# Altium footprint library Connector_PinHeader_2.00mm.PcbLib: 278 footprints (part 3 of 18)
Each footprint in its own frame and in the unit in brackets; x right, y up, seen from the top. Pads: shape width x height; smd on the part's side, far side on the other; paste and mask are expansions set on the pad; w line width, h text height; cw(c..) or ccw(c..) is an arc to the next point about the centre after c.
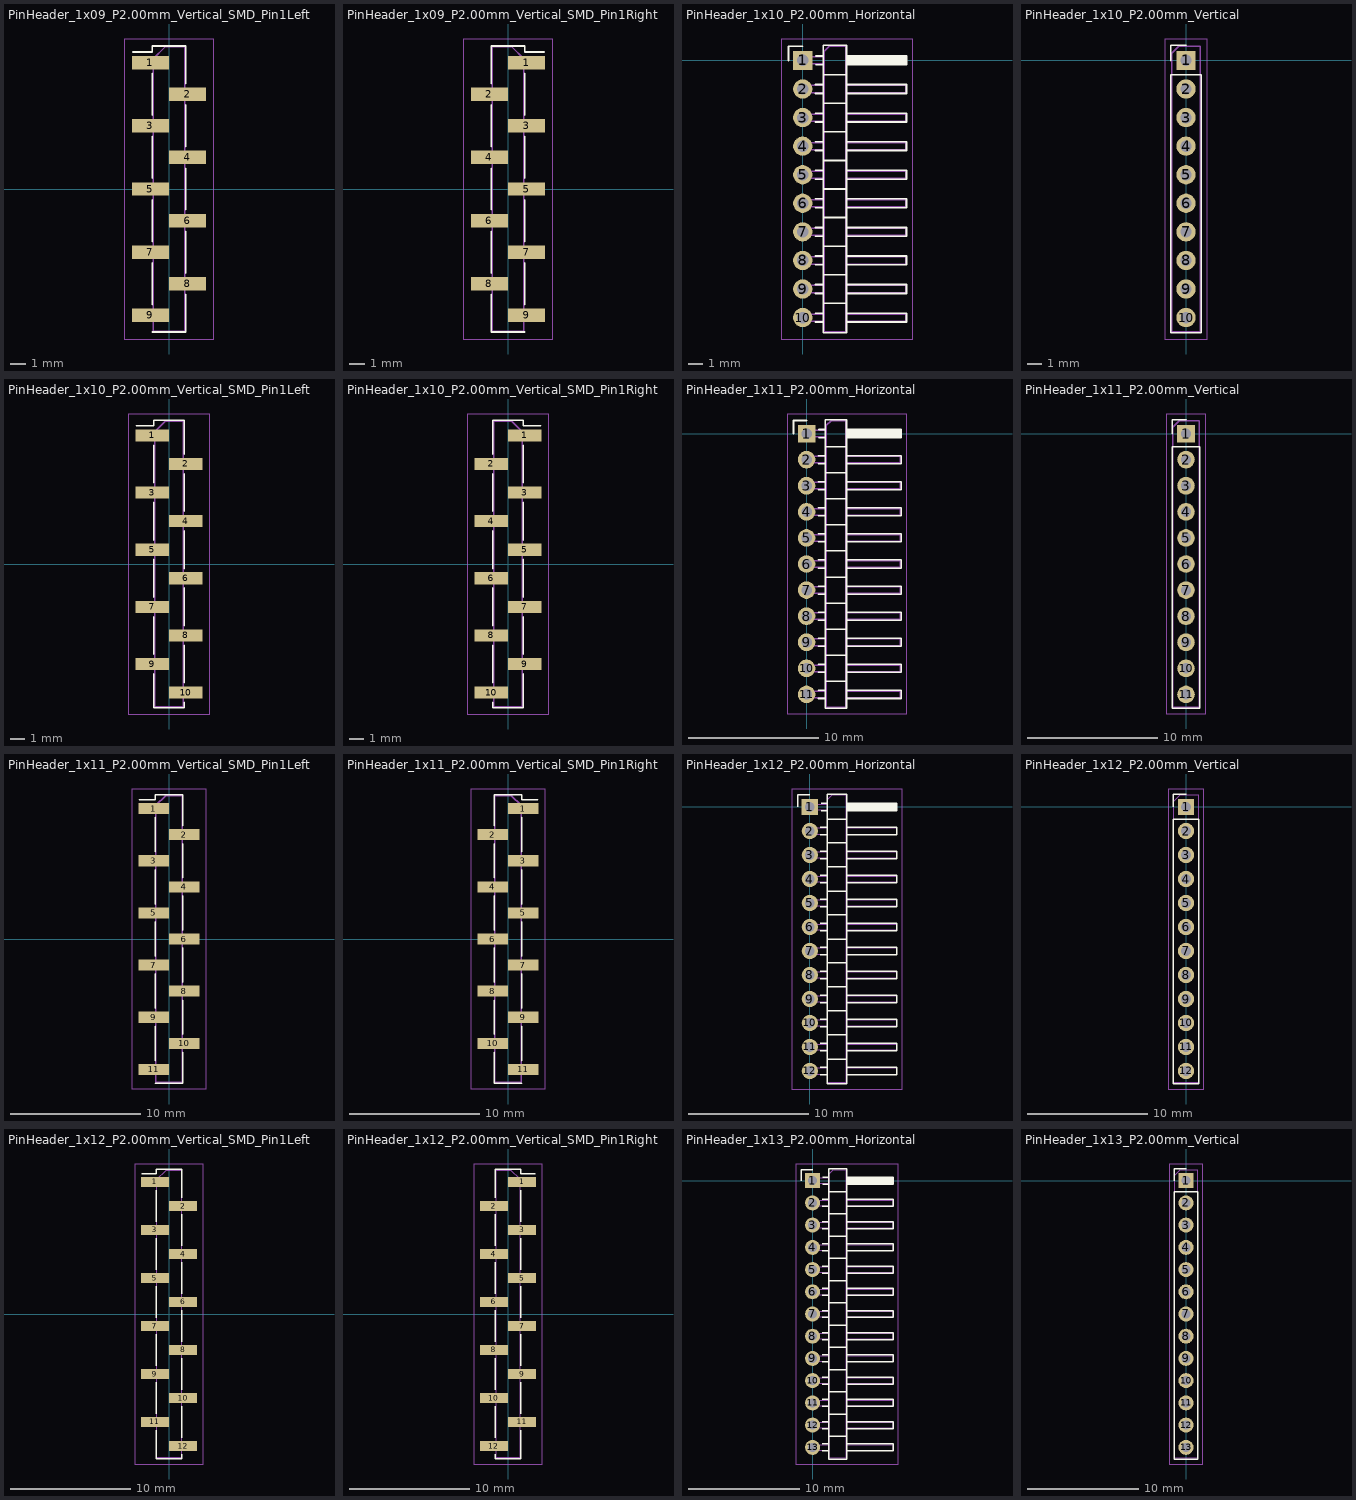
[diagram p2: the footprints below, top view; thin cyan lines are the x and y axes]

## PinHeader_1x09_P2.00mm_Vertical_SMD_Pin1Left [mm]
pads (9):
  rect 2.35x0.85 smd: 1(-1.175,8) 2(1.175,6) 3(-1.175,4) 4(1.175,2) 5(-1.175,0) 6(1.175,-2) 7(-1.175,-4) 8(1.175,-6) 9(-1.175,-8)
F.SilkS:
  lines w0.12: -2.29,8.685 -1.06,8.685 -1.06,9.06 1.06,9.06 1.06,6.685 ; -1.06,-9.06 1.06,-9.06 ; -1.06,-7.315 -1.06,-4.685 ; -1.06,-3.315 -1.06,-0.685 ; -1.06,0.685 -1.06,3.315 ; -1.06,4.685 -1.06,7.315 ; 1.06,-8.685 1.06,-9.06 ; 1.06,-6.685 1.06,-9.06 ; 1.06,-5.315 1.06,-2.685 ; 1.06,-1.315 1.06,1.315 ; 1.06,2.685 1.06,5.315
F.CrtYd:
  lines w0.05: -2.85,-9.5 2.85,-9.5 2.85,9.5 -2.85,9.5 -2.85,-9.5
F.Fab:
  lines w0.1: -1,-8.25 -2.1,-8.25 -2.1,-7.75 -1,-7.75 ; -1,-4.25 -2.1,-4.25 -2.1,-3.75 -1,-3.75 ; -1,-0.25 -2.1,-0.25 -2.1,0.25 -1,0.25 ; -1,3.75 -2.1,3.75 -2.1,4.25 -1,4.25 ; -1,7.75 -2.1,7.75 -2.1,8.25 -1,8.25 ; 1,-6.25 2.1,-6.25 2.1,-5.75 1,-5.75 ; 1,-2.25 2.1,-2.25 2.1,-1.75 1,-1.75 ; 1,1.75 2.1,1.75 2.1,2.25 1,2.25 ; 1,5.75 2.1,5.75 2.1,6.25 1,6.25 ; -1,8.25 -0.25,9 1,9 1,-9 -1,-9 -1,8.25
  text "'.Designator'" at 0.84,-4.047 h1

## PinHeader_1x09_P2.00mm_Vertical_SMD_Pin1Right [mm]
pads (9):
  rect 2.35x0.85 smd: 1(1.175,8) 2(-1.175,6) 3(1.175,4) 4(-1.175,2) 5(1.175,0) 6(-1.175,-2) 7(1.175,-4) 8(-1.175,-6) 9(1.175,-8)
F.SilkS:
  lines w0.12: -1.06,-8.685 -1.06,-9.06 ; -1.06,-6.685 -1.06,-9.06 ; -1.06,-5.315 -1.06,-2.685 ; -1.06,-1.315 -1.06,1.315 ; -1.06,2.685 -1.06,5.315 ; -1.06,6.685 -1.06,9.06 1.06,9.06 1.06,8.685 2.29,8.685 ; 1.06,-9.06 -1.06,-9.06 ; 1.06,-7.315 1.06,-4.685 ; 1.06,-3.315 1.06,-0.685 ; 1.06,0.685 1.06,3.315 ; 1.06,4.685 1.06,7.315
F.CrtYd:
  lines w0.05: -2.85,-9.5 2.85,-9.5 2.85,9.5 -2.85,9.5 -2.85,-9.5
F.Fab:
  lines w0.1: -1,-6.25 -2.1,-6.25 -2.1,-5.75 -1,-5.75 ; -1,-2.25 -2.1,-2.25 -2.1,-1.75 -1,-1.75 ; -1,1.75 -2.1,1.75 -2.1,2.25 -1,2.25 ; -1,5.75 -2.1,5.75 -2.1,6.25 -1,6.25 ; 1,-8.25 2.1,-8.25 2.1,-7.75 1,-7.75 ; 1,-4.25 2.1,-4.25 2.1,-3.75 1,-3.75 ; 1,-0.25 2.1,-0.25 2.1,0.25 1,0.25 ; 1,3.75 2.1,3.75 2.1,4.25 1,4.25 ; 1,7.75 2.1,7.75 2.1,8.25 1,8.25 ; 1,8.25 1,-9 -1,-9 -1,9 0.25,9 1,8.25
  text "'.Designator'" at 0.84,-4.047 h1

## PinHeader_1x10_P2.00mm_Horizontal [mm]
pads (10):
  rect 1.35x1.35 hole 0.8: 1(0,0)
  rrect100% 1.35x1.35 hole 0.8: 2(0,-2) 3(0,-4) 4(0,-6) 5(0,-8) 6(0,-10) 7(0,-12) 8(0,-14) 9(0,-16) 10(0,-18)
F.SilkS:
  lines w0.12: -1,0 -1,1 0,1 ; 0.882,-18.31 1.44,-18.31 ; 0.882,-17.69 1.44,-17.69 ; 0.882,-16.31 1.44,-16.31 ; 0.882,-15.69 1.44,-15.69 ; 0.882,-14.31 1.44,-14.31 ; 0.882,-13.69 1.44,-13.69 ; 0.882,-12.31 1.44,-12.31 ; 0.882,-11.69 1.44,-11.69 ; 0.882,-10.31 1.44,-10.31 ; 0.882,-9.69 1.44,-9.69 ; 0.882,-8.31 1.44,-8.31 ; 0.882,-7.69 1.44,-7.69 ; 0.882,-6.31 1.44,-6.31 ; 0.882,-5.69 1.44,-5.69 ; 0.882,-4.31 1.44,-4.31 ; 0.882,-3.69 1.44,-3.69 ; 0.882,-2.31 1.44,-2.31 ; 0.882,-1.69 1.44,-1.69 ; 0.935,-0.31 1.44,-0.31 ; 0.935,0.31 1.44,0.31 ; 1.44,-17 3.06,-17 ; 1.44,-15 3.06,-15 ; 1.44,-13 3.06,-13 ; 1.44,-11 3.06,-11 ; 1.44,-9 3.06,-9 ; 1.44,-7 3.06,-7 ; 1.44,-5 3.06,-5 ; 1.44,-3 3.06,-3 ; 1.44,-1 3.06,-1 ; 3.06,-18.31 7.26,-18.31 7.26,-17.69 3.06,-17.69 ; 3.06,-16.31 7.26,-16.31 7.26,-15.69 3.06,-15.69 ; 3.06,-14.31 7.26,-14.31 7.26,-13.69 3.06,-13.69 ; 3.06,-12.31 7.26,-12.31 7.26,-11.69 3.06,-11.69 ; 3.06,-10.31 7.26,-10.31 7.26,-9.69 3.06,-9.69 ; 3.06,-8.31 7.26,-8.31 7.26,-7.69 3.06,-7.69 ; 3.06,-6.31 7.26,-6.31 7.26,-5.69 3.06,-5.69 ; 3.06,-4.31 7.26,-4.31 7.26,-3.69 3.06,-3.69 ; 3.06,-2.31 7.26,-2.31 7.26,-1.69 3.06,-1.69 ; 3.06,-0.31 7.26,-0.31 7.26,0.31 3.06,0.31 ; 3.06,-0.23 7.26,-0.23 ; 3.06,-0.11 7.26,-0.11 ; 3.06,0.01 7.26,0.01 ; 3.06,0.13 7.26,0.13 ; 3.06,0.25 7.26,0.25 ; 1.44,-19.06 1.44,1.06 3.06,1.06 3.06,-19.06 1.44,-19.06
F.CrtYd:
  lines w0.05: -1.5,-19.5 -1.5,1.5 7.7,1.5 7.7,-19.5 -1.5,-19.5
F.Fab:
  lines w0.1: 1.5,-18.25 -0.25,-18.25 -0.25,-17.75 1.5,-17.75 ; 1.5,-16.25 -0.25,-16.25 -0.25,-15.75 1.5,-15.75 ; 1.5,-14.25 -0.25,-14.25 -0.25,-13.75 1.5,-13.75 ; 1.5,-12.25 -0.25,-12.25 -0.25,-11.75 1.5,-11.75 ; 1.5,-10.25 -0.25,-10.25 -0.25,-9.75 1.5,-9.75 ; 1.5,-8.25 -0.25,-8.25 -0.25,-7.75 1.5,-7.75 ; 1.5,-6.25 -0.25,-6.25 -0.25,-5.75 1.5,-5.75 ; 1.5,-4.25 -0.25,-4.25 -0.25,-3.75 1.5,-3.75 ; 1.5,-2.25 -0.25,-2.25 -0.25,-1.75 1.5,-1.75 ; 1.5,-0.25 -0.25,-0.25 -0.25,0.25 1.5,0.25 ; 3,-18.25 7.2,-18.25 7.2,-17.75 3,-17.75 ; 3,-16.25 7.2,-16.25 7.2,-15.75 3,-15.75 ; 3,-14.25 7.2,-14.25 7.2,-13.75 3,-13.75 ; 3,-12.25 7.2,-12.25 7.2,-11.75 3,-11.75 ; 3,-10.25 7.2,-10.25 7.2,-9.75 3,-9.75 ; 3,-8.25 7.2,-8.25 7.2,-7.75 3,-7.75 ; 3,-6.25 7.2,-6.25 7.2,-5.75 3,-5.75 ; 3,-4.25 7.2,-4.25 7.2,-3.75 3,-3.75 ; 3,-2.25 7.2,-2.25 7.2,-1.75 3,-1.75 ; 3,-0.25 7.2,-0.25 7.2,0.25 3,0.25 ; 1.5,-19 1.5,0.625 1.875,1 3,1 3,-19 1.5,-19
  text "'.Designator'" at 3.006,-12.642 h0.9

## PinHeader_1x10_P2.00mm_Vertical [mm]
pads (10):
  rect 1.35x1.35 hole 0.8: 1(0,0)
  rrect100% 1.35x1.35 hole 0.8: 2(0,-2) 3(0,-4) 4(0,-6) 5(0,-8) 6(0,-10) 7(0,-12) 8(0,-14) 9(0,-16) 10(0,-18)
F.SilkS:
  lines w0.12: -1.06,0 -1.06,1.06 0,1.06 ; -1.06,-19.06 1.06,-19.06 1.06,-1 -1.06,-1 -1.06,-19.06
F.CrtYd:
  lines w0.05: -1.5,-19.5 -1.5,1.5 1.5,1.5 1.5,-19.5 -1.5,-19.5
F.Fab:
  lines w0.1: -1,-19 -1,0.5 -0.5,1 1,1 1,-19 -1,-19
  text "'.Designator'" at 0.84,-13.047 h1

## PinHeader_1x10_P2.00mm_Vertical_SMD_Pin1Left [mm]
pads (10):
  rect 2.35x0.85 smd: 1(-1.175,9) 2(1.175,7) 3(-1.175,5) 4(1.175,3) 5(-1.175,1) 6(1.175,-1) 7(-1.175,-3) 8(1.175,-5) 9(-1.175,-7) 10(1.175,-9)
F.SilkS:
  lines w0.12: -2.29,9.685 -1.06,9.685 -1.06,10.06 1.06,10.06 1.06,7.685 ; -1.06,-7.685 -1.06,-10.06 1.06,-10.06 1.06,-9.685 ; -1.06,-6.315 -1.06,-3.685 ; -1.06,-2.315 -1.06,0.315 ; -1.06,1.685 -1.06,4.315 ; -1.06,5.685 -1.06,8.315 ; 1.06,-8.315 1.06,-5.685 ; 1.06,-4.315 1.06,-1.685 ; 1.06,-0.315 1.06,2.315 ; 1.06,3.685 1.06,6.315
F.CrtYd:
  lines w0.05: -2.85,-10.5 -2.85,10.5 2.85,10.5 2.85,-10.5 -2.85,-10.5
F.Fab:
  lines w0.1: -1,-7.25 -2.1,-7.25 -2.1,-6.75 -1,-6.75 ; -1,-3.25 -2.1,-3.25 -2.1,-2.75 -1,-2.75 ; -1,0.75 -2.1,0.75 -2.1,1.25 -1,1.25 ; -1,4.75 -2.1,4.75 -2.1,5.25 -1,5.25 ; -1,8.75 -2.1,8.75 -2.1,9.25 -1,9.25 ; 1,-9.25 2.1,-9.25 2.1,-8.75 1,-8.75 ; 1,-5.25 2.1,-5.25 2.1,-4.75 1,-4.75 ; 1,-1.25 2.1,-1.25 2.1,-0.75 1,-0.75 ; 1,2.75 2.1,2.75 2.1,3.25 1,3.25 ; 1,6.75 2.1,6.75 2.1,7.25 1,7.25 ; -1,9.25 -0.25,10 1,10 1,-10 -1,-10 -1,9.25
  text "'.Designator'" at 0.84,-4.047 h1

## PinHeader_1x10_P2.00mm_Vertical_SMD_Pin1Right [mm]
pads (10):
  rect 2.35x0.85 smd: 1(1.175,9) 2(-1.175,7) 3(1.175,5) 4(-1.175,3) 5(1.175,1) 6(-1.175,-1) 7(1.175,-3) 8(-1.175,-5) 9(1.175,-7) 10(-1.175,-9)
F.SilkS:
  lines w0.12: -1.06,-9.685 -1.06,-10.06 1.06,-10.06 1.06,-7.685 ; -1.06,-8.315 -1.06,-5.685 ; -1.06,-4.315 -1.06,-1.685 ; -1.06,-0.315 -1.06,2.315 ; -1.06,3.685 -1.06,6.315 ; -1.06,7.685 -1.06,10.06 1.06,10.06 1.06,9.685 2.29,9.685 ; 1.06,-6.315 1.06,-3.685 ; 1.06,-2.315 1.06,0.315 ; 1.06,1.685 1.06,4.315 ; 1.06,5.685 1.06,8.315
F.CrtYd:
  lines w0.05: -2.85,-10.5 2.85,-10.5 2.85,10.5 -2.85,10.5 -2.85,-10.5
F.Fab:
  lines w0.1: -1,-9.25 -2.1,-9.25 -2.1,-8.75 -1,-8.75 ; -1,-5.25 -2.1,-5.25 -2.1,-4.75 -1,-4.75 ; -1,-1.25 -2.1,-1.25 -2.1,-0.75 -1,-0.75 ; -1,2.75 -2.1,2.75 -2.1,3.25 -1,3.25 ; -1,6.75 -2.1,6.75 -2.1,7.25 -1,7.25 ; 1,-7.25 2.1,-7.25 2.1,-6.75 1,-6.75 ; 1,-3.25 2.1,-3.25 2.1,-2.75 1,-2.75 ; 1,0.75 2.1,0.75 2.1,1.25 1,1.25 ; 1,4.75 2.1,4.75 2.1,5.25 1,5.25 ; 1,8.75 2.1,8.75 2.1,9.25 1,9.25 ; 1,9.25 1,-10 -1,-10 -1,10 0.25,10 1,9.25
  text "'.Designator'" at 0.84,-4.047 h1

## PinHeader_1x11_P2.00mm_Horizontal [mm]
pads (11):
  rect 1.35x1.35 hole 0.8: 1(0,0)
  rrect100% 1.35x1.35 hole 0.8: 2(0,-2) 3(0,-4) 4(0,-6) 5(0,-8) 6(0,-10) 7(0,-12) 8(0,-14) 9(0,-16) 10(0,-18) 11(0,-20)
F.SilkS:
  lines w0.12: -1,0 -1,1 0,1 ; 0.882,-20.31 1.44,-20.31 ; 0.882,-19.69 1.44,-19.69 ; 0.882,-18.31 1.44,-18.31 ; 0.882,-17.69 1.44,-17.69 ; 0.882,-16.31 1.44,-16.31 ; 0.882,-15.69 1.44,-15.69 ; 0.882,-14.31 1.44,-14.31 ; 0.882,-13.69 1.44,-13.69 ; 0.882,-12.31 1.44,-12.31 ; 0.882,-11.69 1.44,-11.69 ; 0.882,-10.31 1.44,-10.31 ; 0.882,-9.69 1.44,-9.69 ; 0.882,-8.31 1.44,-8.31 ; 0.882,-7.69 1.44,-7.69 ; 0.882,-6.31 1.44,-6.31 ; 0.882,-5.69 1.44,-5.69 ; 0.882,-4.31 1.44,-4.31 ; 0.882,-3.69 1.44,-3.69 ; 0.882,-2.31 1.44,-2.31 ; 0.882,-1.69 1.44,-1.69 ; 0.935,-0.31 1.44,-0.31 ; 0.935,0.31 1.44,0.31 ; 1.44,-19 3.06,-19 ; 1.44,-17 3.06,-17 ; 1.44,-15 3.06,-15 ; 1.44,-13 3.06,-13 ; 1.44,-11 3.06,-11 ; 1.44,-9 3.06,-9 ; 1.44,-7 3.06,-7 ; 1.44,-5 3.06,-5 ; 1.44,-3 3.06,-3 ; 1.44,-1 3.06,-1 ; 3.06,-20.31 7.26,-20.31 7.26,-19.69 3.06,-19.69 ; 3.06,-18.31 7.26,-18.31 7.26,-17.69 3.06,-17.69 ; 3.06,-16.31 7.26,-16.31 7.26,-15.69 3.06,-15.69 ; 3.06,-14.31 7.26,-14.31 7.26,-13.69 3.06,-13.69 ; 3.06,-12.31 7.26,-12.31 7.26,-11.69 3.06,-11.69 ; 3.06,-10.31 7.26,-10.31 7.26,-9.69 3.06,-9.69 ; 3.06,-8.31 7.26,-8.31 7.26,-7.69 3.06,-7.69 ; 3.06,-6.31 7.26,-6.31 7.26,-5.69 3.06,-5.69 ; 3.06,-4.31 7.26,-4.31 7.26,-3.69 3.06,-3.69 ; 3.06,-2.31 7.26,-2.31 7.26,-1.69 3.06,-1.69 ; 3.06,-0.31 7.26,-0.31 7.26,0.31 3.06,0.31 ; 3.06,-0.23 7.26,-0.23 ; 3.06,-0.11 7.26,-0.11 ; 3.06,0.01 7.26,0.01 ; 3.06,0.13 7.26,0.13 ; 3.06,0.25 7.26,0.25 ; 1.44,-21.06 1.44,1.06 3.06,1.06 3.06,-21.06 1.44,-21.06
F.CrtYd:
  lines w0.05: -1.5,-21.5 -1.5,1.5 7.7,1.5 7.7,-21.5 -1.5,-21.5
F.Fab:
  lines w0.1: 1.5,-20.25 -0.25,-20.25 -0.25,-19.75 1.5,-19.75 ; 1.5,-18.25 -0.25,-18.25 -0.25,-17.75 1.5,-17.75 ; 1.5,-16.25 -0.25,-16.25 -0.25,-15.75 1.5,-15.75 ; 1.5,-14.25 -0.25,-14.25 -0.25,-13.75 1.5,-13.75 ; 1.5,-12.25 -0.25,-12.25 -0.25,-11.75 1.5,-11.75 ; 1.5,-10.25 -0.25,-10.25 -0.25,-9.75 1.5,-9.75 ; 1.5,-8.25 -0.25,-8.25 -0.25,-7.75 1.5,-7.75 ; 1.5,-6.25 -0.25,-6.25 -0.25,-5.75 1.5,-5.75 ; 1.5,-4.25 -0.25,-4.25 -0.25,-3.75 1.5,-3.75 ; 1.5,-2.25 -0.25,-2.25 -0.25,-1.75 1.5,-1.75 ; 1.5,-0.25 -0.25,-0.25 -0.25,0.25 1.5,0.25 ; 3,-20.25 7.2,-20.25 7.2,-19.75 3,-19.75 ; 3,-18.25 7.2,-18.25 7.2,-17.75 3,-17.75 ; 3,-16.25 7.2,-16.25 7.2,-15.75 3,-15.75 ; 3,-14.25 7.2,-14.25 7.2,-13.75 3,-13.75 ; 3,-12.25 7.2,-12.25 7.2,-11.75 3,-11.75 ; 3,-10.25 7.2,-10.25 7.2,-9.75 3,-9.75 ; 3,-8.25 7.2,-8.25 7.2,-7.75 3,-7.75 ; 3,-6.25 7.2,-6.25 7.2,-5.75 3,-5.75 ; 3,-4.25 7.2,-4.25 7.2,-3.75 3,-3.75 ; 3,-2.25 7.2,-2.25 7.2,-1.75 3,-1.75 ; 3,-0.25 7.2,-0.25 7.2,0.25 3,0.25 ; 1.5,-21 3,-21 3,1 1.875,1 1.5,0.625 1.5,-21
  text "'.Designator'" at 3.006,-13.642 h0.9

## PinHeader_1x11_P2.00mm_Vertical [mm]
pads (11):
  rect 1.35x1.35 hole 0.8: 1(0,0)
  rrect100% 1.35x1.35 hole 0.8: 2(0,-2) 3(0,-4) 4(0,-6) 5(0,-8) 6(0,-10) 7(0,-12) 8(0,-14) 9(0,-16) 10(0,-18) 11(0,-20)
F.SilkS:
  lines w0.12: -1.06,0 -1.06,1.06 0,1.06 ; -1.06,-21.06 -1.06,-1 1.06,-1 1.06,-21.06 -1.06,-21.06
F.CrtYd:
  lines w0.05: -1.5,-21.5 -1.5,1.5 1.5,1.5 1.5,-21.5 -1.5,-21.5
F.Fab:
  lines w0.1: -1,-21 1,-21 1,1 -0.5,1 -1,0.5 -1,-21
  text "'.Designator'" at 0.84,-14.047 h1

## PinHeader_1x11_P2.00mm_Vertical_SMD_Pin1Left [mm]
pads (11):
  rect 2.35x0.85 smd: 1(-1.175,10) 2(1.175,8) 3(-1.175,6) 4(1.175,4) 5(-1.175,2) 6(1.175,0) 7(-1.175,-2) 8(1.175,-4) 9(-1.175,-6) 10(1.175,-8) 11(-1.175,-10)
F.SilkS:
  lines w0.12: -2.29,10.685 -1.06,10.685 -1.06,11.06 1.06,11.06 1.06,8.685 ; -1.06,-11.06 1.06,-11.06 ; -1.06,-9.315 -1.06,-6.685 ; -1.06,-5.315 -1.06,-2.685 ; -1.06,-1.315 -1.06,1.315 ; -1.06,2.685 -1.06,5.315 ; -1.06,6.685 -1.06,9.315 ; 1.06,-10.685 1.06,-11.06 ; 1.06,-8.685 1.06,-11.06 ; 1.06,-7.315 1.06,-4.685 ; 1.06,-3.315 1.06,-0.685 ; 1.06,0.685 1.06,3.315 ; 1.06,4.685 1.06,7.315
F.CrtYd:
  lines w0.05: -2.85,-11.5 2.85,-11.5 2.85,11.5 -2.85,11.5 -2.85,-11.5
F.Fab:
  lines w0.1: -1,-10.25 -2.1,-10.25 -2.1,-9.75 -1,-9.75 ; -1,-6.25 -2.1,-6.25 -2.1,-5.75 -1,-5.75 ; -1,-2.25 -2.1,-2.25 -2.1,-1.75 -1,-1.75 ; -1,1.75 -2.1,1.75 -2.1,2.25 -1,2.25 ; -1,5.75 -2.1,5.75 -2.1,6.25 -1,6.25 ; -1,9.75 -2.1,9.75 -2.1,10.25 -1,10.25 ; 1,-8.25 2.1,-8.25 2.1,-7.75 1,-7.75 ; 1,-4.25 2.1,-4.25 2.1,-3.75 1,-3.75 ; 1,-0.25 2.1,-0.25 2.1,0.25 1,0.25 ; 1,3.75 2.1,3.75 2.1,4.25 1,4.25 ; 1,7.75 2.1,7.75 2.1,8.25 1,8.25 ; -1,10.25 -1,-11 1,-11 1,11 -0.25,11 -1,10.25
  text "'.Designator'" at 0.84,-4.047 h1

## PinHeader_1x11_P2.00mm_Vertical_SMD_Pin1Right [mm]
pads (11):
  rect 2.35x0.85 smd: 1(1.175,10) 2(-1.175,8) 3(1.175,6) 4(-1.175,4) 5(1.175,2) 6(-1.175,0) 7(1.175,-2) 8(-1.175,-4) 9(1.175,-6) 10(-1.175,-8) 11(1.175,-10)
F.SilkS:
  lines w0.12: -1.06,-10.685 -1.06,-11.06 ; -1.06,-8.685 -1.06,-11.06 ; -1.06,-7.315 -1.06,-4.685 ; -1.06,-3.315 -1.06,-0.685 ; -1.06,0.685 -1.06,3.315 ; -1.06,4.685 -1.06,7.315 ; -1.06,8.685 -1.06,11.06 1.06,11.06 1.06,10.685 2.29,10.685 ; 1.06,-11.06 -1.06,-11.06 ; 1.06,-9.315 1.06,-6.685 ; 1.06,-5.315 1.06,-2.685 ; 1.06,-1.315 1.06,1.315 ; 1.06,2.685 1.06,5.315 ; 1.06,6.685 1.06,9.315
F.CrtYd:
  lines w0.05: -2.85,-11.5 -2.85,11.5 2.85,11.5 2.85,-11.5 -2.85,-11.5
F.Fab:
  lines w0.1: -1,-8.25 -2.1,-8.25 -2.1,-7.75 -1,-7.75 ; -1,-4.25 -2.1,-4.25 -2.1,-3.75 -1,-3.75 ; -1,-0.25 -2.1,-0.25 -2.1,0.25 -1,0.25 ; -1,3.75 -2.1,3.75 -2.1,4.25 -1,4.25 ; -1,7.75 -2.1,7.75 -2.1,8.25 -1,8.25 ; 1,-10.25 2.1,-10.25 2.1,-9.75 1,-9.75 ; 1,-6.25 2.1,-6.25 2.1,-5.75 1,-5.75 ; 1,-2.25 2.1,-2.25 2.1,-1.75 1,-1.75 ; 1,1.75 2.1,1.75 2.1,2.25 1,2.25 ; 1,5.75 2.1,5.75 2.1,6.25 1,6.25 ; 1,9.75 2.1,9.75 2.1,10.25 1,10.25 ; 1,10.25 1,-11 -1,-11 -1,11 0.25,11 1,10.25
  text "'.Designator'" at 0.84,-4.047 h1

## PinHeader_1x12_P2.00mm_Horizontal [mm]
pads (12):
  rect 1.35x1.35 hole 0.8: 1(0,0)
  rrect100% 1.35x1.35 hole 0.8: 2(0,-2) 3(0,-4) 4(0,-6) 5(0,-8) 6(0,-10) 7(0,-12) 8(0,-14) 9(0,-16) 10(0,-18) 11(0,-20) 12(0,-22)
F.SilkS:
  lines w0.12: -1,0 -1,1 0,1 ; 0.882,-22.31 1.44,-22.31 ; 0.882,-21.69 1.44,-21.69 ; 0.882,-20.31 1.44,-20.31 ; 0.882,-19.69 1.44,-19.69 ; 0.882,-18.31 1.44,-18.31 ; 0.882,-17.69 1.44,-17.69 ; 0.882,-16.31 1.44,-16.31 ; 0.882,-15.69 1.44,-15.69 ; 0.882,-14.31 1.44,-14.31 ; 0.882,-13.69 1.44,-13.69 ; 0.882,-12.31 1.44,-12.31 ; 0.882,-11.69 1.44,-11.69 ; 0.882,-10.31 1.44,-10.31 ; 0.882,-9.69 1.44,-9.69 ; 0.882,-8.31 1.44,-8.31 ; 0.882,-7.69 1.44,-7.69 ; 0.882,-6.31 1.44,-6.31 ; 0.882,-5.69 1.44,-5.69 ; 0.882,-4.31 1.44,-4.31 ; 0.882,-3.69 1.44,-3.69 ; 0.882,-2.31 1.44,-2.31 ; 0.882,-1.69 1.44,-1.69 ; 0.935,-0.31 1.44,-0.31 ; 0.935,0.31 1.44,0.31 ; 1.44,-21 3.06,-21 ; 1.44,-19 3.06,-19 ; 1.44,-17 3.06,-17 ; 1.44,-15 3.06,-15 ; 1.44,-13 3.06,-13 ; 1.44,-11 3.06,-11 ; 1.44,-9 3.06,-9 ; 1.44,-7 3.06,-7 ; 1.44,-5 3.06,-5 ; 1.44,-3 3.06,-3 ; 1.44,-1 3.06,-1 ; 3.06,-22.31 7.26,-22.31 7.26,-21.69 3.06,-21.69 ; 3.06,-20.31 7.26,-20.31 7.26,-19.69 3.06,-19.69 ; 3.06,-18.31 7.26,-18.31 7.26,-17.69 3.06,-17.69 ; 3.06,-16.31 7.26,-16.31 7.26,-15.69 3.06,-15.69 ; 3.06,-14.31 7.26,-14.31 7.26,-13.69 3.06,-13.69 ; 3.06,-12.31 7.26,-12.31 7.26,-11.69 3.06,-11.69 ; 3.06,-10.31 7.26,-10.31 7.26,-9.69 3.06,-9.69 ; 3.06,-8.31 7.26,-8.31 7.26,-7.69 3.06,-7.69 ; 3.06,-6.31 7.26,-6.31 7.26,-5.69 3.06,-5.69 ; 3.06,-4.31 7.26,-4.31 7.26,-3.69 3.06,-3.69 ; 3.06,-2.31 7.26,-2.31 7.26,-1.69 3.06,-1.69 ; 3.06,-0.31 7.26,-0.31 7.26,0.31 3.06,0.31 ; 3.06,-0.23 7.26,-0.23 ; 3.06,-0.11 7.26,-0.11 ; 3.06,0.01 7.26,0.01 ; 3.06,0.13 7.26,0.13 ; 3.06,0.25 7.26,0.25 ; 1.44,-23.06 3.06,-23.06 3.06,1.06 1.44,1.06 1.44,-23.06
F.CrtYd:
  lines w0.05: -1.5,-23.5 -1.5,1.5 7.7,1.5 7.7,-23.5 -1.5,-23.5
F.Fab:
  lines w0.1: 1.5,-22.25 -0.25,-22.25 -0.25,-21.75 1.5,-21.75 ; 1.5,-20.25 -0.25,-20.25 -0.25,-19.75 1.5,-19.75 ; 1.5,-18.25 -0.25,-18.25 -0.25,-17.75 1.5,-17.75 ; 1.5,-16.25 -0.25,-16.25 -0.25,-15.75 1.5,-15.75 ; 1.5,-14.25 -0.25,-14.25 -0.25,-13.75 1.5,-13.75 ; 1.5,-12.25 -0.25,-12.25 -0.25,-11.75 1.5,-11.75 ; 1.5,-10.25 -0.25,-10.25 -0.25,-9.75 1.5,-9.75 ; 1.5,-8.25 -0.25,-8.25 -0.25,-7.75 1.5,-7.75 ; 1.5,-6.25 -0.25,-6.25 -0.25,-5.75 1.5,-5.75 ; 1.5,-4.25 -0.25,-4.25 -0.25,-3.75 1.5,-3.75 ; 1.5,-2.25 -0.25,-2.25 -0.25,-1.75 1.5,-1.75 ; 1.5,-0.25 -0.25,-0.25 -0.25,0.25 1.5,0.25 ; 3,-22.25 7.2,-22.25 7.2,-21.75 3,-21.75 ; 3,-20.25 7.2,-20.25 7.2,-19.75 3,-19.75 ; 3,-18.25 7.2,-18.25 7.2,-17.75 3,-17.75 ; 3,-16.25 7.2,-16.25 7.2,-15.75 3,-15.75 ; 3,-14.25 7.2,-14.25 7.2,-13.75 3,-13.75 ; 3,-12.25 7.2,-12.25 7.2,-11.75 3,-11.75 ; 3,-10.25 7.2,-10.25 7.2,-9.75 3,-9.75 ; 3,-8.25 7.2,-8.25 7.2,-7.75 3,-7.75 ; 3,-6.25 7.2,-6.25 7.2,-5.75 3,-5.75 ; 3,-4.25 7.2,-4.25 7.2,-3.75 3,-3.75 ; 3,-2.25 7.2,-2.25 7.2,-1.75 3,-1.75 ; 3,-0.25 7.2,-0.25 7.2,0.25 3,0.25 ; 1.5,-23 3,-23 3,1 1.875,1 1.5,0.625 1.5,-23
  text "'.Designator'" at 3.006,-14.642 h0.9

## PinHeader_1x12_P2.00mm_Vertical [mm]
pads (12):
  rect 1.35x1.35 hole 0.8: 1(0,0)
  rrect100% 1.35x1.35 hole 0.8: 2(0,-2) 3(0,-4) 4(0,-6) 5(0,-8) 6(0,-10) 7(0,-12) 8(0,-14) 9(0,-16) 10(0,-18) 11(0,-20) 12(0,-22)
F.SilkS:
  lines w0.12: -1.06,0 -1.06,1.06 0,1.06 ; -1.06,-23.06 1.06,-23.06 1.06,-1 -1.06,-1 -1.06,-23.06
F.CrtYd:
  lines w0.05: -1.5,-23.5 1.5,-23.5 1.5,1.5 -1.5,1.5 -1.5,-23.5
F.Fab:
  lines w0.1: -1,-23 -1,0.5 -0.5,1 1,1 1,-23 -1,-23
  text "'.Designator'" at 0.84,-15.047 h1

## PinHeader_1x12_P2.00mm_Vertical_SMD_Pin1Left [mm]
pads (12):
  rect 2.35x0.85 smd: 1(-1.175,11) 2(1.175,9) 3(-1.175,7) 4(1.175,5) 5(-1.175,3) 6(1.175,1) 7(-1.175,-1) 8(1.175,-3) 9(-1.175,-5) 10(1.175,-7) 11(-1.175,-9) 12(1.175,-11)
F.SilkS:
  lines w0.12: -2.29,11.685 -1.06,11.685 -1.06,12.06 1.06,12.06 1.06,9.685 ; -1.06,-9.685 -1.06,-12.06 1.06,-12.06 1.06,-11.685 ; -1.06,-8.315 -1.06,-5.685 ; -1.06,-4.315 -1.06,-1.685 ; -1.06,-0.315 -1.06,2.315 ; -1.06,3.685 -1.06,6.315 ; -1.06,7.685 -1.06,10.315 ; 1.06,-10.315 1.06,-7.685 ; 1.06,-6.315 1.06,-3.685 ; 1.06,-2.315 1.06,0.315 ; 1.06,1.685 1.06,4.315 ; 1.06,5.685 1.06,8.315
F.CrtYd:
  lines w0.05: -2.85,-12.5 -2.85,12.5 2.85,12.5 2.85,-12.5 -2.85,-12.5
F.Fab:
  lines w0.1: -1,-9.25 -2.1,-9.25 -2.1,-8.75 -1,-8.75 ; -1,-5.25 -2.1,-5.25 -2.1,-4.75 -1,-4.75 ; -1,-1.25 -2.1,-1.25 -2.1,-0.75 -1,-0.75 ; -1,2.75 -2.1,2.75 -2.1,3.25 -1,3.25 ; -1,6.75 -2.1,6.75 -2.1,7.25 -1,7.25 ; -1,10.75 -2.1,10.75 -2.1,11.25 -1,11.25 ; 1,-11.25 2.1,-11.25 2.1,-10.75 1,-10.75 ; 1,-7.25 2.1,-7.25 2.1,-6.75 1,-6.75 ; 1,-3.25 2.1,-3.25 2.1,-2.75 1,-2.75 ; 1,0.75 2.1,0.75 2.1,1.25 1,1.25 ; 1,4.75 2.1,4.75 2.1,5.25 1,5.25 ; 1,8.75 2.1,8.75 2.1,9.25 1,9.25 ; -1,11.25 -0.25,12 1,12 1,-12 -1,-12 -1,11.25
  text "'.Designator'" at 0.84,-4.047 h1

## PinHeader_1x12_P2.00mm_Vertical_SMD_Pin1Right [mm]
pads (12):
  rect 2.35x0.85 smd: 1(1.175,11) 2(-1.175,9) 3(1.175,7) 4(-1.175,5) 5(1.175,3) 6(-1.175,1) 7(1.175,-1) 8(-1.175,-3) 9(1.175,-5) 10(-1.175,-7) 11(1.175,-9) 12(-1.175,-11)
F.SilkS:
  lines w0.12: -1.06,-11.685 -1.06,-12.06 1.06,-12.06 1.06,-9.685 ; -1.06,-10.315 -1.06,-7.685 ; -1.06,-6.315 -1.06,-3.685 ; -1.06,-2.315 -1.06,0.315 ; -1.06,1.685 -1.06,4.315 ; -1.06,5.685 -1.06,8.315 ; -1.06,9.685 -1.06,12.06 1.06,12.06 1.06,11.685 2.29,11.685 ; 1.06,-8.315 1.06,-5.685 ; 1.06,-4.315 1.06,-1.685 ; 1.06,-0.315 1.06,2.315 ; 1.06,3.685 1.06,6.315 ; 1.06,7.685 1.06,10.315
F.CrtYd:
  lines w0.05: -2.85,-12.5 2.85,-12.5 2.85,12.5 -2.85,12.5 -2.85,-12.5
F.Fab:
  lines w0.1: -1,-11.25 -2.1,-11.25 -2.1,-10.75 -1,-10.75 ; -1,-7.25 -2.1,-7.25 -2.1,-6.75 -1,-6.75 ; -1,-3.25 -2.1,-3.25 -2.1,-2.75 -1,-2.75 ; -1,0.75 -2.1,0.75 -2.1,1.25 -1,1.25 ; -1,4.75 -2.1,4.75 -2.1,5.25 -1,5.25 ; -1,8.75 -2.1,8.75 -2.1,9.25 -1,9.25 ; 1,-9.25 2.1,-9.25 2.1,-8.75 1,-8.75 ; 1,-5.25 2.1,-5.25 2.1,-4.75 1,-4.75 ; 1,-1.25 2.1,-1.25 2.1,-0.75 1,-0.75 ; 1,2.75 2.1,2.75 2.1,3.25 1,3.25 ; 1,6.75 2.1,6.75 2.1,7.25 1,7.25 ; 1,10.75 2.1,10.75 2.1,11.25 1,11.25 ; 1,11.25 0.25,12 -1,12 -1,-12 1,-12 1,11.25
  text "'.Designator'" at 0.84,-4.047 h1

## PinHeader_1x13_P2.00mm_Horizontal [mm]
pads (13):
  rect 1.35x1.35 hole 0.8: 1(0,0)
  rrect100% 1.35x1.35 hole 0.8: 2(0,-2) 3(0,-4) 4(0,-6) 5(0,-8) 6(0,-10) 7(0,-12) 8(0,-14) 9(0,-16) 10(0,-18) 11(0,-20) 12(0,-22) 13(0,-24)
F.SilkS:
  lines w0.12: -1,0 -1,1 0,1 ; 0.882,-24.31 1.44,-24.31 ; 0.882,-23.69 1.44,-23.69 ; 0.882,-22.31 1.44,-22.31 ; 0.882,-21.69 1.44,-21.69 ; 0.882,-20.31 1.44,-20.31 ; 0.882,-19.69 1.44,-19.69 ; 0.882,-18.31 1.44,-18.31 ; 0.882,-17.69 1.44,-17.69 ; 0.882,-16.31 1.44,-16.31 ; 0.882,-15.69 1.44,-15.69 ; 0.882,-14.31 1.44,-14.31 ; 0.882,-13.69 1.44,-13.69 ; 0.882,-12.31 1.44,-12.31 ; 0.882,-11.69 1.44,-11.69 ; 0.882,-10.31 1.44,-10.31 ; 0.882,-9.69 1.44,-9.69 ; 0.882,-8.31 1.44,-8.31 ; 0.882,-7.69 1.44,-7.69 ; 0.882,-6.31 1.44,-6.31 ; 0.882,-5.69 1.44,-5.69 ; 0.882,-4.31 1.44,-4.31 ; 0.882,-3.69 1.44,-3.69 ; 0.882,-2.31 1.44,-2.31 ; 0.882,-1.69 1.44,-1.69 ; 0.935,-0.31 1.44,-0.31 ; 0.935,0.31 1.44,0.31 ; 1.44,-23 3.06,-23 ; 1.44,-21 3.06,-21 ; 1.44,-19 3.06,-19 ; 1.44,-17 3.06,-17 ; 1.44,-15 3.06,-15 ; 1.44,-13 3.06,-13 ; 1.44,-11 3.06,-11 ; 1.44,-9 3.06,-9 ; 1.44,-7 3.06,-7 ; 1.44,-5 3.06,-5 ; 1.44,-3 3.06,-3 ; 1.44,-1 3.06,-1 ; 3.06,-24.31 7.26,-24.31 7.26,-23.69 3.06,-23.69 ; 3.06,-22.31 7.26,-22.31 7.26,-21.69 3.06,-21.69 ; 3.06,-20.31 7.26,-20.31 7.26,-19.69 3.06,-19.69 ; 3.06,-18.31 7.26,-18.31 7.26,-17.69 3.06,-17.69 ; 3.06,-16.31 7.26,-16.31 7.26,-15.69 3.06,-15.69 ; 3.06,-14.31 7.26,-14.31 7.26,-13.69 3.06,-13.69 ; 3.06,-12.31 7.26,-12.31 7.26,-11.69 3.06,-11.69 ; 3.06,-10.31 7.26,-10.31 7.26,-9.69 3.06,-9.69 ; 3.06,-8.31 7.26,-8.31 7.26,-7.69 3.06,-7.69 ; 3.06,-6.31 7.26,-6.31 7.26,-5.69 3.06,-5.69 ; 3.06,-4.31 7.26,-4.31 7.26,-3.69 3.06,-3.69 ; 3.06,-2.31 7.26,-2.31 7.26,-1.69 3.06,-1.69 ; 3.06,-0.31 7.26,-0.31 7.26,0.31 3.06,0.31 ; 3.06,-0.23 7.26,-0.23 ; 3.06,-0.11 7.26,-0.11 ; 3.06,0.01 7.26,0.01 ; 3.06,0.13 7.26,0.13 ; 3.06,0.25 7.26,0.25 ; 1.44,-25.06 3.06,-25.06 3.06,1.06 1.44,1.06 1.44,-25.06
F.CrtYd:
  lines w0.05: -1.5,-25.5 -1.5,1.5 7.7,1.5 7.7,-25.5 -1.5,-25.5
F.Fab:
  lines w0.1: 1.5,-24.25 -0.25,-24.25 -0.25,-23.75 1.5,-23.75 ; 1.5,-22.25 -0.25,-22.25 -0.25,-21.75 1.5,-21.75 ; 1.5,-20.25 -0.25,-20.25 -0.25,-19.75 1.5,-19.75 ; 1.5,-18.25 -0.25,-18.25 -0.25,-17.75 1.5,-17.75 ; 1.5,-16.25 -0.25,-16.25 -0.25,-15.75 1.5,-15.75 ; 1.5,-14.25 -0.25,-14.25 -0.25,-13.75 1.5,-13.75 ; 1.5,-12.25 -0.25,-12.25 -0.25,-11.75 1.5,-11.75 ; 1.5,-10.25 -0.25,-10.25 -0.25,-9.75 1.5,-9.75 ; 1.5,-8.25 -0.25,-8.25 -0.25,-7.75 1.5,-7.75 ; 1.5,-6.25 -0.25,-6.25 -0.25,-5.75 1.5,-5.75 ; 1.5,-4.25 -0.25,-4.25 -0.25,-3.75 1.5,-3.75 ; 1.5,-2.25 -0.25,-2.25 -0.25,-1.75 1.5,-1.75 ; 1.5,-0.25 -0.25,-0.25 -0.25,0.25 1.5,0.25 ; 3,-24.25 7.2,-24.25 7.2,-23.75 3,-23.75 ; 3,-22.25 7.2,-22.25 7.2,-21.75 3,-21.75 ; 3,-20.25 7.2,-20.25 7.2,-19.75 3,-19.75 ; 3,-18.25 7.2,-18.25 7.2,-17.75 3,-17.75 ; 3,-16.25 7.2,-16.25 7.2,-15.75 3,-15.75 ; 3,-14.25 7.2,-14.25 7.2,-13.75 3,-13.75 ; 3,-12.25 7.2,-12.25 7.2,-11.75 3,-11.75 ; 3,-10.25 7.2,-10.25 7.2,-9.75 3,-9.75 ; 3,-8.25 7.2,-8.25 7.2,-7.75 3,-7.75 ; 3,-6.25 7.2,-6.25 7.2,-5.75 3,-5.75 ; 3,-4.25 7.2,-4.25 7.2,-3.75 3,-3.75 ; 3,-2.25 7.2,-2.25 7.2,-1.75 3,-1.75 ; 3,-0.25 7.2,-0.25 7.2,0.25 3,0.25 ; 1.5,-25 3,-25 3,1 1.875,1 1.5,0.625 1.5,-25
  text "'.Designator'" at 3.006,-15.642 h0.9

## PinHeader_1x13_P2.00mm_Vertical [mm]
pads (13):
  rect 1.35x1.35 hole 0.8: 1(0,0)
  rrect100% 1.35x1.35 hole 0.8: 2(0,-2) 3(0,-4) 4(0,-6) 5(0,-8) 6(0,-10) 7(0,-12) 8(0,-14) 9(0,-16) 10(0,-18) 11(0,-20) 12(0,-22) 13(0,-24)
F.SilkS:
  lines w0.12: -1.06,0 -1.06,1.06 0,1.06 ; -1.06,-25.06 -1.06,-1 1.06,-1 1.06,-25.06 -1.06,-25.06
F.CrtYd:
  lines w0.05: -1.5,-25.5 -1.5,1.5 1.5,1.5 1.5,-25.5 -1.5,-25.5
F.Fab:
  lines w0.1: -1,-25 1,-25 1,1 -0.5,1 -1,0.5 -1,-25
  text "'.Designator'" at 0.84,-16.047 h1